# Altium footprint library Calipso V2.0 REV2.0 (new origin)1.PcbLib: 45 footprints (part 3 of 3)
Each footprint in its own frame and in the unit in brackets; x right, y up, seen from the top. Pads: shape width x height; smd on the part's side, far side on the other; paste and mask are expansions set on the pad; w line width, h text height; cw(c..) or ccw(c..) is an arc to the next point about the centre after c.
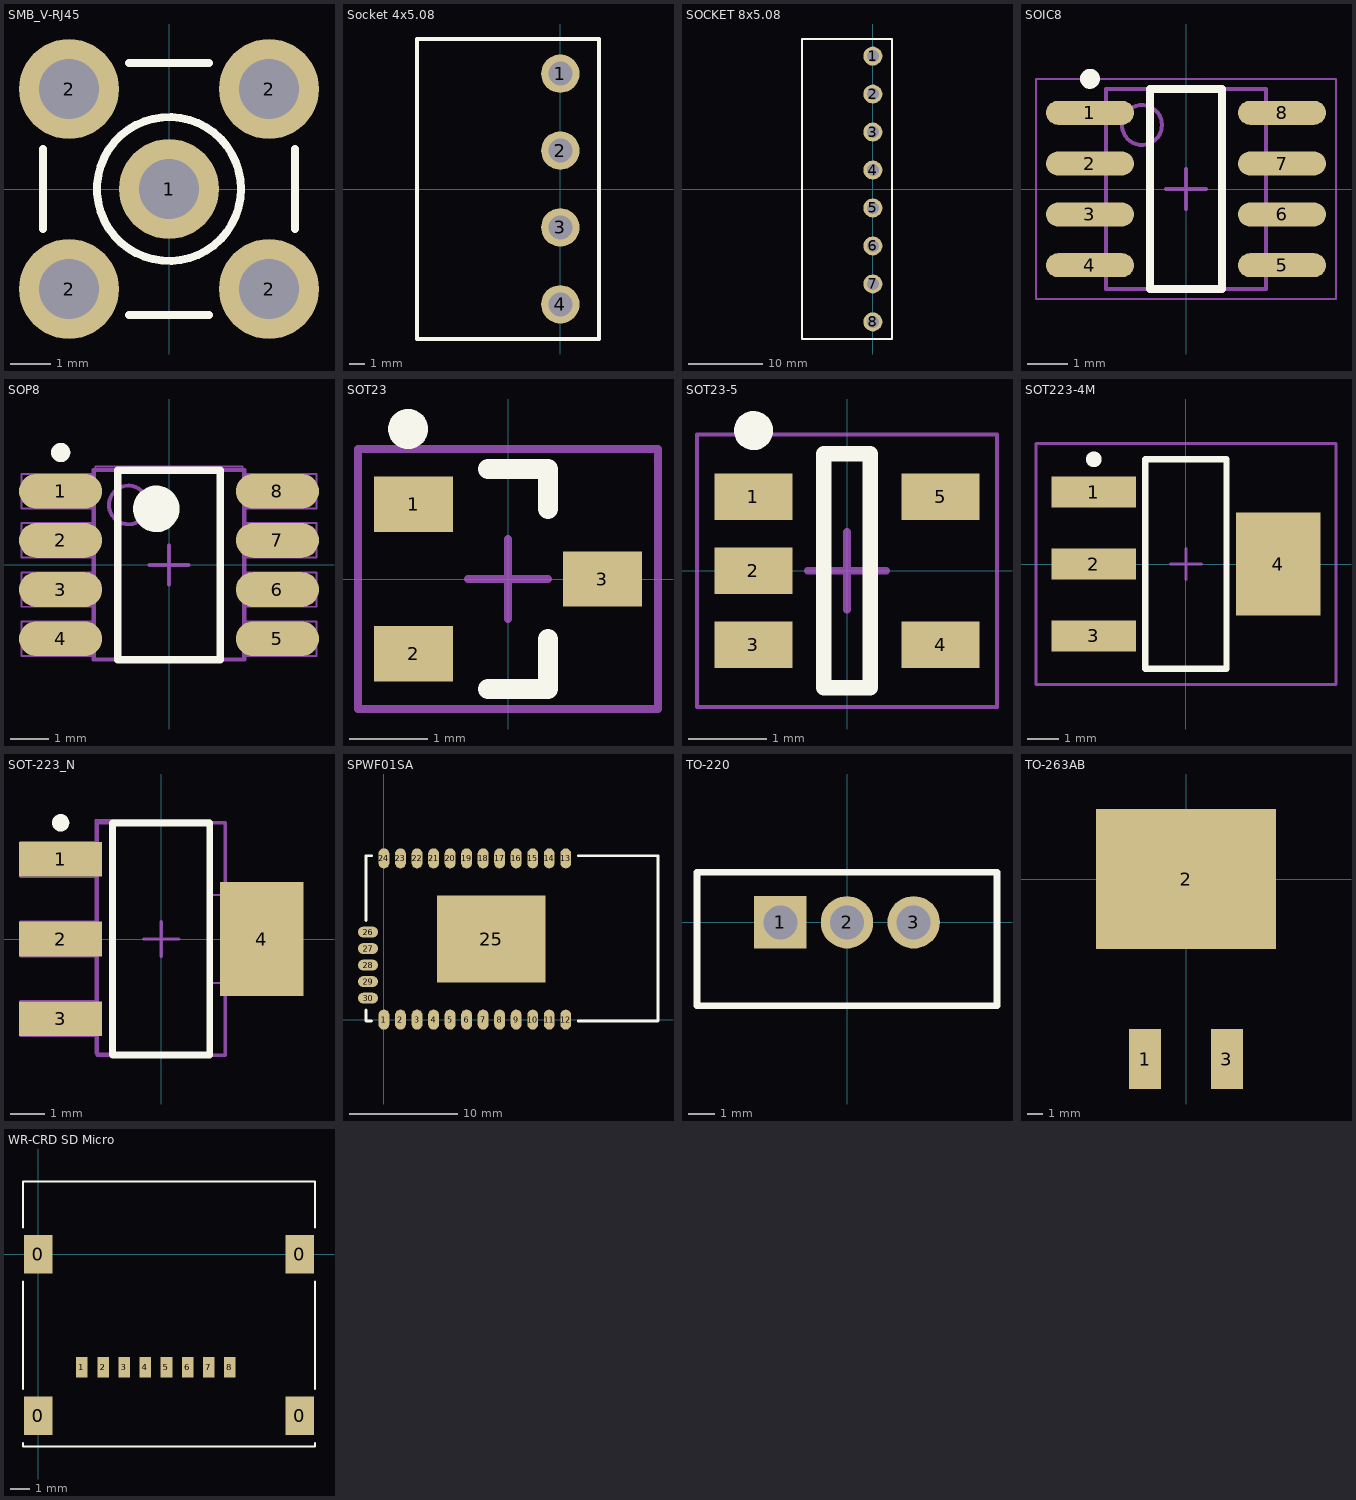
[diagram p2: the footprints below, top view; thin cyan lines are the x and y axes]

## SMB_V-RJ45 [mm]
pads (5):
  round 2.5 hole 1.5: 1(0,0) 2(-2.5,-2.5) 2(-2.5,2.5) 2(2.5,-2.5) 2(2.5,2.5)
Top Overlay:
  circle w0.2: c0,0 r1.8
  lines w0.2: -3.15,-1 -3.15,1 ; -1,-3.15 1,-3.15 ; -1,3.15 1,3.15 ; 3.15,-1 3.15,1
Mechanical 1:
  circle w0.025: c0,0 r1.8
  circle w0.025: c0,0 r1.05
  circle w0.025: c0,0 r0.2

## Socket 4x5.08 [mm]
pads (4):
  round 2.54 hole 1.6: 1(0,7.62) 2(0,2.54) 3(0,-2.54) 4(0,-7.62)
Top Overlay:
  lines w0.254: -9.46,-9.906 -9.46,9.906 2.54,9.906 2.54,-9.906 -9.46,-9.906
3D body "TerminalBlockSocket4x5.08mm.stp": height 8.5, standoff -3.49, extent -9.968,-10.16 2.032,10.16

## SOCKET 8x5.08 [mm]
pads (8):
  round 2.54 hole 1.6: 1(0,17.78) 2(0,12.7) 3(0,7.62) 4(0,2.54) 5(0,-2.54) 6(0,-7.62) 7(0,-12.7) 8(0,-17.78)
Top Overlay:
  lines w0.254: -9.46,-20.066 -9.46,20.066 2.54,20.066 2.54,-20.066 -9.46,-20.066
3D body "TerminalBlockSocket8x5.08mm.stp": height 8.5, standoff -3.49, extent -9.968,-20.32 2.032,20.32

## SOIC8 [mm]
pads (8):
  oval 2.2x0.6 smd: 1(-2.4,1.905) 2(-2.4,0.635) 3(-2.4,-0.635) 4(-2.4,-1.905) 5(2.4,-1.905) 6(2.4,-0.635) 7(2.4,0.635) 8(2.4,1.905)
Top Overlay:
  circle w0.25: c-2.4,2.755 r0.125
  lines w0.2: -0.9,-2.5 -0.9,2.5 0.9,2.5 0.9,-2.5 -0.9,-2.5
Mechanical 13:
  circle w0.1: c-1.1,1.6 r0.5
  lines w0.1: -2,-2.5 -2,2.5 2,2.5 2,-2.5 -2,-2.5
Mechanical 15:
  lines w0.05: -3.75,-2.75 -3.75,2.75 3.75,2.75 3.75,-2.75 -3.75,-2.75
  lines w0.1: -0.5,0 0.5,0 ; 0,-0.5 0,0.5
3D body "SO8.STEP": height 1.61, standoff 0.01, extent -2.995,-2.45 2.995,2.45

## SOP8 [mm]
pads (8):
  oval 2.15x0.9 smd: 1(-2.8,1.905) 2(-2.8,0.635) 3(-2.8,-0.635) 4(-2.8,-1.905) 5(2.8,-1.905) 6(2.8,-0.635) 7(2.8,0.635) 8(2.8,1.905)
Top Overlay:
  circle w0.6: c-0.325,1.45 r0.3
  circle w0.25: c-2.8,2.905 r0.125
  lines w0.2: -1.325,-2.45 1.325,-2.45 1.325,2.45 -1.325,2.45 -1.325,-2.45
Mechanical 13:
  circle w0.1: c-1.05,1.55 r0.5
  lines w0.1: -1.95,-2.45 1.95,-2.45 1.95,2.45 -1.95,2.45 -1.95,-2.45
Mechanical 15:
  lines w0.05: -1.905,-2.349 -3.81,-2.349 -3.81,-1.46 -1.905,-1.46 ; -1.905,-1.079 -3.81,-1.079 -3.81,-0.191 -1.905,-0.191 ; -1.905,0.191 -3.81,0.191 -3.81,1.079 -1.905,1.079 ; -1.905,1.46 -3.81,1.46 -3.81,2.349 -1.905,2.349 ; 1.905,-2.349 3.81,-2.349 3.81,-1.46 1.905,-1.46 ; 1.905,-1.079 3.81,-1.079 3.81,-0.191 1.905,-0.191 ; 1.905,0.191 3.81,0.191 3.81,1.079 1.905,1.079 ; 1.905,1.46 3.81,1.46 3.81,2.349 1.905,2.349 ; -1.905,-2.413 1.905,-2.413 1.905,2.54 -1.905,2.54 -1.905,-2.413
  lines w0.1: -0.5,0 0.5,0 ; 0,-0.5 0,0.5
3D body: height 1.75, standoff 0.1, extent -1.95,-2.45 1.95,2.45

## SOT23 [mm]
pads (3):
  rect 1x0.7 smd: 1(-1.2,0.95) 2(-1.2,-0.95) 3(1.2,0)
Top Overlay:
  circle w0.254: c-1.27,1.905 r0.127
  lines w0.254: -0.254,-1.397 0.508,-1.397 0.508,-0.762 ; -0.254,1.397 0.508,1.397 0.508,0.889
Mechanical 15:
  lines w0.1: -0.508,0 0.508,0 ; 0,-0.508 0,0.508 ; -1.905,-1.651 1.905,-1.651 1.905,1.651 -1.905,1.651 -1.905,-1.651
3D body "User Library-SOT95P240X110-3M[SOT23-3_TO-236AB].STEP": height 1.09, standoff 0, extent -1.25,-1.5 1.25,1.5

## SOT23-5 [mm]
pads (5):
  rect 1x0.6 smd: 1(-1.2,0.95) 2(-1.2,0) 3(-1.2,-0.95) 4(1.2,-0.95) 5(1.2,0.95)
Top Overlay:
  circle w0.25: c-1.2,1.8 r0.125
  lines w0.2: -0.3,-1.5 0.3,-1.5 0.3,1.5 -0.3,1.5 -0.3,-1.5
Mechanical 15:
  lines w0.05: -1.925,-1.75 -1.925,1.75 1.925,1.75 1.925,-1.75 -1.925,-1.75
  lines w0.1: -0.5,0 0.5,0 ; 0,-0.5 0,0.5
3D body "SOT23-5.STEP": height 1.24, standoff 0.14, extent -1.397,-1.45 1.403,1.45

## SOT223-4M [mm]
pads (4):
  rect 2.7x1 smd: 1(-2.95,2.3) 2(-2.95,0) 3(-2.95,-2.3)
  rect 2.7x3.3 smd: 4(2.95,0)
Top Overlay:
  circle w0.25: c-2.95,3.35 r0.125
  lines w0.2: -1.3,-3.35 1.3,-3.35 1.3,3.35 -1.3,3.35 -1.3,-3.35
Mechanical 15:
  lines w0.1: -0.5,0 0.5,0 ; 0,-0.5 0,0.5 ; -4.8,-3.85 4.8,-3.85 4.8,3.85 -4.8,3.85 -4.8,-3.85
3D body "User Library-SOT223-3.STEP": height 1.7, standoff 0, extent -3.5,-3.25 3.5,3.25

## SOT-223_N [mm]
pads (4):
  rect 2.4x1 smd: 1(-2.9,2.3) 2(-2.9,0) 3(-2.9,-2.3)
  rect 2.4x3.3 smd: 4(2.9,0)
Top Overlay:
  circle w0.25: c-2.9,3.35 r0.125
  lines w0.2: -1.4,-3.35 -1.4,3.35 1.4,3.35 1.4,-3.35 -1.4,-3.35
Mechanical 13:
  lines w0.1: -1.85,-3.35 -1.85,3.35 1.85,3.35 1.85,-3.35 -1.85,-3.35
Mechanical 15:
  lines w0.05: -1.905,-2.794 -4.064,-2.794 -4.064,-1.778 -1.905,-1.778 ; -1.905,-0.508 -4.064,-0.508 -4.064,0.508 -1.905,0.508 ; -1.905,1.778 -4.064,1.778 -4.064,2.794 -1.905,2.794 ; 1.397,-1.27 3.81,-1.27 3.81,1.27 1.397,1.27 ; -1.905,-3.302 -1.905,3.429 1.397,3.429 1.397,-3.302 -1.905,-3.302
  lines w0.1: -0.5,0 0.5,0 ; 0,-0.5 0,0.5
3D body "SOT223-3.STEP": height 1.7, standoff 0, extent -3.5,-3.25 3.5,3.25

## SPWF01SA [mm]
pads (30):
  rrect100% 1x1.85 smd: 1(0,0) 2(1.524,0) 3(3.048,0) 4(4.572,0) 5(6.096,0) 6(7.62,0) 7(9.144,0) 8(10.668,0) 9(12.192,0) 10(13.716,0) 11(15.24,0) 12(16.764,0) 13(16.764,14.87) 14(15.24,14.87) 15(13.716,14.87) 16(12.192,14.87) 17(10.668,14.87) 18(9.144,14.87) 19(7.62,14.87) 20(6.096,14.87) 21(4.572,14.87) 22(3.048,14.87) 23(1.524,14.87) 24(0,14.87)
  rect 10x8 smd: 25(9.9,7.435)
  rrect100% 1.85x1 smd: 26(-1.47,8.076) 27(-1.47,6.552) 28(-1.47,5.028) 29(-1.47,3.504) 30(-1.47,1.98)
Top Overlay:
  lines w0.254: -1.651,0.889 -1.651,-0.127 -1.143,-0.127 ; -1.651,9.144 -1.651,15.113 -1.143,15.113 ; 17.907,-0.127 25.273,-0.127 25.273,15.113 17.907,15.113
3D body "SPWF01SA.STEP": height 2.35, standoff -0.01, extent -1.651,-0.127 25.273,15.113

## TO-220 [mm]
pads (3):
  rect 2x2 hole 1.3: 1(-2.54,0)
  round 2 hole 1.3: 2(0,0) 3(2.54,0)
Top Overlay:
  lines w0.254: -5.715,-3.175 5.715,-3.175 5.715,1.905 -5.715,1.905 -5.715,-3.175
3D body "TO-220.stp": height 22.62, standoff -8.37, extent -5.335,-3.179 5.335,1.651

## TO-263AB [mm]
pads (3):
  rect 2.03x3.81 smd: 1(-2.595,-11.43) 3(2.595,-11.43)
  rect 11.43x8.89 smd: 2(0,0)
3D body "TO263-3S.STEP": height 4.81, standoff 0.01, extent -5,-12.61 5,3.06

## WR-CRD SD Micro [mm]
pads (12):
  rect 1.5x2 smd: 0(0,-8.4) 0(0,0) 0(13.6,-8.4) 0(13.6,0)
  rect 0.6x1.05 smd: 1(2.27,-5.87) 2(3.37,-5.87) 3(4.47,-5.87) 4(5.57,-5.87) 5(6.67,-5.87) 6(7.77,-5.87) 7(8.87,-5.87) 8(9.97,-5.87)
Top Overlay:
  lines w0.1: -0.8,-9.8 -0.8,-10 14.4,-10 14.4,-9.8 ; -0.8,-7 -0.8,-1.4 ; -0.8,1.4 -0.8,3.8 14.4,3.8 14.4,1.4 ; 14.4,-7 14.4,-1.4
3D body "Card Connector SD Micro.stp": height 1.77, standoff 0, extent -0.5,-9.9 14.1,3.8